# Altium footprint library DBLib.PcbLib: 92 footprints (part 2 of 6)
Each footprint in its own frame and in the unit in brackets; x right, y up, seen from the top. Pads: shape width x height; smd on the part's side, far side on the other; paste and mask are expansions set on the pad; w line width, h text height; cw(c..) or ccw(c..) is an arc to the next point about the centre after c.
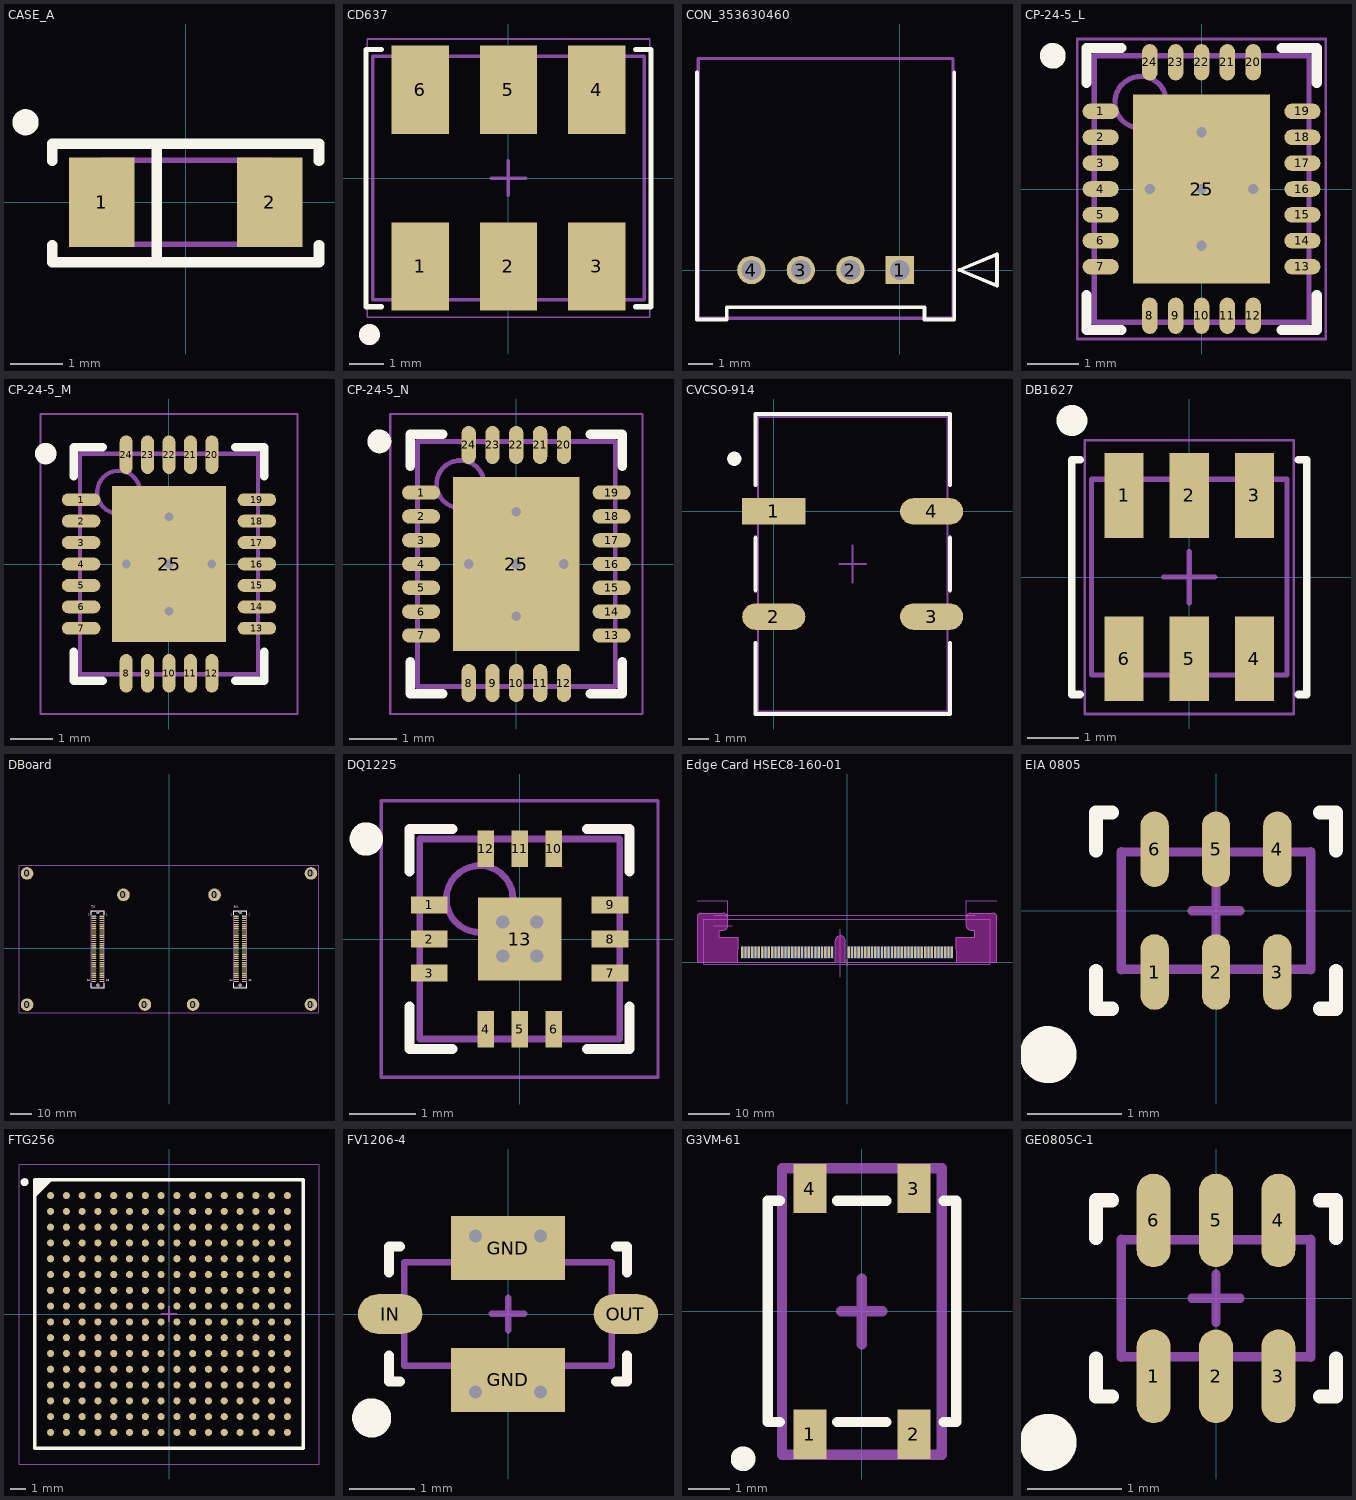
[diagram p1: the footprints below, top view; thin cyan lines are the x and y axes]

## CASE_A [mm] "Tantalum Cap"
height 0.5
pads (2):
  rect 1.25x1.7 smd: 1(-1.6,0) 2(1.6,0)
Top Overlay:
  circle w0.25: c-3.048,1.524 r0.125
  lines w0.2: -2.54,-0.815 -2.54,-1.143 2.54,-1.143 2.54,-0.815 ; -2.54,0.787 -2.54,1.115 2.54,1.115 2.54,0.787 ; -0.546,-1.143 -0.546,1.115
Mechanical 1:
  lines w0.1: -1.6,-0.8 -1.6,0.8 1.6,0.8 1.6,-0.8 -1.6,-0.8
3D body "User Library-Tantalum Capacitor Case A.STEP": height 1.65, standoff 0, extent -1.698,-0.802 1.693,0.798

## CD637 [mm] "RF Transformer"
height 5.23
pads (6):
  rect 1.65x2.54 smd: 1(-2.54,-2.54) 2(0,-2.54) 3(2.54,-2.54) 4(2.54,2.54) 5(0,2.54) 6(-2.54,2.54)
Top Overlay:
  circle w0.35: c-4,-4.5 r0.127
  lines w0.15: -3.65,-3.7 -4.1,-3.7 -4.1,3.7 -3.65,3.7 ; 3.65,-3.7 4.1,-3.7 4.1,3.7 3.65,3.7
Mechanical 1:
  lines w0.05: -4.064,-4 4.064,-4 4.064,4 -4.064,4 -4.064,-4
  lines w0.1: -0.5,0 0.5,0 ; 0,-0.5 0,0.5 ; -3.9,-3.5 3.9,-3.5 3.9,3.5 -3.9,3.5 -3.9,-3.5
3D body "User Library-CD637.step": height 5.24, standoff 0, extent -3.935,-3.455 3.935,3.455

## CON_353630460 [mm]
pads (4):
  rect 1.15x1.15 hole 0.8 mask+0.076: 1(0,0)
  round 1.15 hole 0.8 mask+0.076: 2(-2,0) 3(-4,0) 4(-6,0)
Top Overlay:
  lines w0.15: -8.2,8 -8.2,-2 -7,-2 -7,-1.5 1,-1.5 1,-2 2.2,-2 2.2,8 ; 2.404,0 3.928,-0.635 3.928,0.635 2.404,0
Mechanical 1:
  lines w0.127: -8.15,-1.95 -8.15,8.55 2.15,8.55 2.15,-1.95 -8.15,-1.95 ; 2.404,0 3.928,-0.635 3.928,0.635 2.404,0
3D body "353630460.stp": height 5.55, standoff -3.15, extent -8.15,-1.95 2.15,8.55
3D body: height 0.25, standoff 0, extent 0,0 0.254,0.254

## CP-24-5_L [mm] "QFN, 24-Leads, Body 4x5mm, Pitch 0.5mm, Thermal Pad 2.65x3.65mm, IPC High Density"
height 1
pads (25):
  oval 0.7x0.3 smd: 1(-1.95,1.5) 2(-1.95,1) 3(-1.95,0.5) 4(-1.95,0) 5(-1.95,-0.5) 6(-1.95,-1) 7(-1.95,-1.5) 13(1.95,-1.5) 14(1.95,-1) 15(1.95,-0.5) 16(1.95,0) 17(1.95,0.5) 18(1.95,1) 19(1.95,1.5)
  oval 0.3x0.7 smd: 8(-1,-2.45) 9(-0.5,-2.45) 10(0,-2.45) 11(0.5,-2.45) 12(1,-2.45) 20(1,2.45) 21(0.5,2.45) 22(0,2.45) 23(-0.5,2.45) 24(-1,2.45)
  rect 2.65x3.65 all layers, no hole paste-1.325 mask+0.102: 25(0,0)
via 0,-1.1 diameter 0.5 hole 0.2
via 1,0 diameter 0.5 hole 0.2
via -1,0 diameter 0.5 hole 0.2
via 0,1.1 diameter 0.5 hole 0.2
via 0,0 diameter 0.5 hole 0.2
Top Overlay:
  circle w0.25: c-2.875,2.575 r0.125
  lines w0.2: -2.225,-2.05 -2.225,-2.725 -1.55,-2.725 ; -2.225,2.05 -2.225,2.725 -1.55,2.725 ; 1.55,-2.725 2.225,-2.725 2.225,-2.05 ; 1.55,2.725 2.225,2.725 2.225,2.05
Top Paste:
  rectangle: 0.15,0.15 1.25,1.75
  region: -0.15,1.75 -1.25,1.75 -1.25,0.15 -0.15,0.15
  region: -0.15,-0.15 -1.25,-0.15 -1.25,-1.75 -0.15,-1.75
  rectangle: 0.15,-1.75 1.25,-0.15
Mechanical 13:
  circle w0.1: c-1.175,1.675 r0.5
  lines w0.1: -2.075,-2.575 2.075,-2.575 2.075,2.575 -2.075,2.575 -2.075,-2.575
Mechanical 15:
  lines w0.05: -2.4,-2.9 2.4,-2.9 2.4,2.9 -2.4,2.9 -2.4,-2.9
  lines w0.1: -0.5,0 0.5,0 ; 0,-0.5 0,0.5
3D body "User Library-AD5760BCPZ.step": height 0.85, standoff -0.05, extent -2.001,-2.501 2.001,2.501

## CP-24-5_M [mm] "QFN, 24-Leads, Body 4x5mm, Pitch 0.5mm, Thermal Pad 2.65x3.65mm, IPC Low Density"
height 1
pads (25):
  oval 0.9x0.3 smd: 1(-2.05,1.5) 2(-2.05,1) 3(-2.05,0.5) 4(-2.05,0) 5(-2.05,-0.5) 6(-2.05,-1) 7(-2.05,-1.5) 13(2.05,-1.5) 14(2.05,-1) 15(2.05,-0.5) 16(2.05,0) 17(2.05,0.5) 18(2.05,1) 19(2.05,1.5)
  oval 0.3x0.9 smd: 8(-1,-2.55) 9(-0.5,-2.55) 10(0,-2.55) 11(0.5,-2.55) 12(1,-2.55) 20(1,2.55) 21(0.5,2.55) 22(0,2.55) 23(-0.5,2.55) 24(-1,2.55)
  rect 2.65x3.65 all layers, no hole paste-1.325 mask+0.102: 25(0,0)
via 0,-1.1 diameter 0.5 hole 0.2
via 1,0 diameter 0.5 hole 0.2
via -1,0 diameter 0.5 hole 0.2
via 0,1.1 diameter 0.5 hole 0.2
via 0,0 diameter 0.5 hole 0.2
Top Overlay:
  circle w0.25: c-2.875,2.575 r0.125
  lines w0.2: -2.225,-2.05 -2.225,-2.725 -1.55,-2.725 ; -2.225,2.05 -2.225,2.725 -1.55,2.725 ; 1.55,-2.725 2.225,-2.725 2.225,-2.05 ; 1.55,2.725 2.225,2.725 2.225,2.05
Top Paste:
  rectangle: 0.15,0.15 1.25,1.75
  region: -0.15,1.75 -1.25,1.75 -1.25,0.15 -0.15,0.15
  region: -0.15,-0.15 -1.25,-0.15 -1.25,-1.75 -0.15,-1.75
  rectangle: 0.15,-1.75 1.25,-0.15
Mechanical 13:
  circle w0.1: c-1.175,1.675 r0.5
  lines w0.1: -2.075,-2.575 -2.075,2.575 2.075,2.575 2.075,-2.575 -2.075,-2.575
Mechanical 15:
  lines w0.05: -3,-3.5 -3,3.5 3,3.5 3,-3.5 -3,-3.5
  lines w0.1: -0.5,0 0.5,0 ; 0,-0.5 0,0.5
3D body "User Library-AD5760BCPZ.step": height 0.85, standoff -0.05, extent -2.001,-2.501 2.001,2.501

## CP-24-5_N [mm] "QFN, 24-Leads, Body 4x5mm, Pitch 0.5mm, Thermal Pad 2.65x3.65mm, IPC Medium Density"
height 1
pads (25):
  oval 0.8x0.3 smd: 1(-2,1.5) 2(-2,1) 3(-2,0.5) 4(-2,0) 5(-2,-0.5) 6(-2,-1) 7(-2,-1.5) 13(2,-1.5) 14(2,-1) 15(2,-0.5) 16(2,0) 17(2,0.5) 18(2,1) 19(2,1.5)
  oval 0.3x0.8 smd: 8(-1,-2.5) 9(-0.5,-2.5) 10(0,-2.5) 11(0.5,-2.5) 12(1,-2.5) 20(1,2.5) 21(0.5,2.5) 22(0,2.5) 23(-0.5,2.5) 24(-1,2.5)
  rect 2.65x3.65 all layers, no hole paste-1.325 mask+0.102: 25(0,0)
via 0,0 diameter 0.5 hole 0.2
via 0,1.1 diameter 0.5 hole 0.2
via -1,0 diameter 0.5 hole 0.2
via 1,0 diameter 0.5 hole 0.2
via 0,-1.1 diameter 0.5 hole 0.2
Top Overlay:
  circle w0.25: c-2.875,2.575 r0.125
  lines w0.2: -2.225,-2.05 -2.225,-2.725 -1.55,-2.725 ; -2.225,2.05 -2.225,2.725 -1.55,2.725 ; 1.55,-2.725 2.225,-2.725 2.225,-2.05 ; 1.55,2.725 2.225,2.725 2.225,2.05
Top Paste:
  rectangle: 0.15,-1.75 1.25,-0.15
  region: -0.15,-0.15 -1.25,-0.15 -1.25,-1.75 -0.15,-1.75
  region: -0.15,1.75 -1.25,1.75 -1.25,0.15 -0.15,0.15
  rectangle: 0.15,0.15 1.25,1.75
Mechanical 13:
  circle w0.1: c-1.175,1.675 r0.5
  lines w0.1: -2.075,-2.575 -2.075,2.575 2.075,2.575 2.075,-2.575 -2.075,-2.575
Mechanical 15:
  lines w0.05: -2.65,-3.15 -2.65,3.15 2.65,3.15 2.65,-3.15 -2.65,-3.15
  lines w0.1: -0.5,0 0.5,0 ; 0,-0.5 0,0.5
3D body "User Library-AD5760BCPZ.step": height 0.85, standoff -0.05, extent -2.001,-2.501 2.001,2.501

## CVCSO-914 [mil] "9?14 mm SMD"
height 210
pads (4):
  rect 120x50 smd: 1(0,0)
  oval 120x50 smd: 2(0,-200) 3(300,-200) 4(300,0)
Top Overlay:
  circle w13.78: c-75,100 r6.63
  lines w7.87: -35,-250 -35,-385 335,-385 335,-250 ; -35,-150 -35,-50 ; -35,50 -35,185 335,185 335,50 ; 335,-150 335,-50
Mechanical 1:
  lines w3.94: 125,-100 175,-100 ; 150,-135 150,-65 ; -30.31,-380 -30.31,179.05 330.31,179.05 330.31,-380 -30.31,-380
3D body "User Library-CVHD-950.step": height 208.66, standoff 0, extent -30.31,-380 330.31,179.05

## DB1627 [mm] "RF Transformer"
height 4.06
pads (6):
  rect 0.76x1.65 smd: 1(-1.27,1.59) 2(0,1.59) 3(1.27,1.59) 4(1.27,-1.59) 5(0,-1.59) 6(-1.27,-1.59)
Top Overlay:
  circle w0.35: c-2.286,3.048 r0.127
  lines w0.15: -2.126,-2.286 -2.286,-2.286 -2.286,2.286 -2.126,2.286 ; 2.126,-2.286 2.286,-2.286 2.286,2.286 2.126,2.286
Mechanical 1:
  lines w0.05: -2.032,-2.667 2.032,-2.667 2.032,2.667 -2.032,2.667 -2.032,-2.667
  lines w0.1: -0.5,0 0.5,0 ; 0,-0.5 0,0.5 ; -1.905,-1.905 1.905,-1.905 1.905,1.905 -1.905,1.905 -1.905,-1.905
3D body "User Library-RF Transformer SMD.step": height 2.79, standoff -0.02, extent -1.905,-1.923 1.905,1.923

## DBoard [mil] "USRP DBoard"
height 393.7
pads (140):
  round 236.22 hole 118.11: 0(-2650,1400) 0(-2649,-1051) 0(-850,1000) 0(-450,-1050) 0(450,-1050) 0(850,1000) 0(2650,-1050) 0(2650,1400)
  round 59.06 hole 59.06 unplated: 0(-1330,-687) 0(-1330,667) 0(1330,-687) 0(1330,667)
  oval 92x24 smd: 1(-1256,600) 2(-1404,600) 3(-1256,561) 4(-1404,561) 5(-1256,522) 6(-1404,522) 7(-1256,482) 8(-1404,482) 9(-1256,443) 10(-1404,443) 11(-1256,404) 12(-1404,404) 13(-1256,364) 14(-1404,364) 15(-1256,325) 16(-1404,325) 17(-1256,286) 18(-1404,286) 19(-1256,246) 20(-1404,246) 21(-1256,207) 22(-1404,207) 23(-1256,167) 24(-1404,167) 25(-1256,128) 26(-1404,128) 27(-1256,89) 28(-1404,89) 29(-1256,49) 30(-1404,49) 31(-1256,10) 32(-1404,10) 33(-1256,-29) 34(-1404,-29) 35(-1256,-69) 36(-1404,-69) 37(-1256,-108) 38(-1404,-108) 39(-1256,-148) 40(-1404,-148) 41(-1256,-187) 42(-1404,-187) 43(-1256,-226) 44(-1404,-226) 45(-1256,-266) 46(-1404,-266) 47(-1256,-305) 48(-1404,-305) 49(-1256,-344) 50(-1404,-344) 51(-1256,-384) 52(-1404,-384) 53(-1256,-423) 54(-1404,-423) 55(-1256,-462) 56(-1404,-462) 57(-1256,-502) 58(-1404,-502) 59(-1256,-541) 60(-1404,-541) 61(-1256,-581) 62(-1404,-581) 63(-1256,-620) 64(-1404,-620) 65(1404,600) 66(1256,600) 67(1404,561) 68(1256,561) 69(1404,522) 70(1256,522) 71(1404,482) 72(1256,482) 73(1404,443) 74(1256,443) 75(1404,404) 76(1256,404) 77(1404,364) 78(1256,364) 79(1404,325) 80(1256,325) 81(1404,286) 82(1256,286) 83(1404,246) 84(1256,246) 85(1404,207) 86(1256,207) 87(1404,167) 88(1256,167) 89(1404,128) 90(1256,128) 91(1404,89) 92(1256,89) 93(1404,49) 94(1256,49) 95(1404,10) 96(1256,10) 97(1404,-29) 98(1256,-29) 99(1404,-69) 100(1256,-69) 101(1404,-108) 102(1256,-108) 103(1404,-148) 104(1256,-148) 105(1404,-187) 106(1256,-187) 107(1404,-226) 108(1256,-226) 109(1404,-266) 110(1256,-266) 111(1404,-305) 112(1256,-305) 113(1404,-344) 114(1256,-344) 115(1404,-384) 116(1256,-384) 117(1404,-423) 118(1256,-423) 119(1404,-462) 120(1256,-462) 121(1404,-502) 122(1256,-502) 123(1404,-541) 124(1256,-541) 125(1404,-581) 126(1256,-581) 127(1404,-620) 128(1256,-620)
Top Overlay:
  lines w7: -1455,-651.9 -1455,-730.64 -1205,-730.64 -1205,-651.9 ; -1455,627.63 -1455,706.37 -1205,706.37 -1205,627.63 ; 1205,-651.9 1205,-730.64 1455,-730.64 1455,-651.9 ; 1205,627.63 1205,706.37 1455,706.37 1455,627.63
  text "64" at 1130,-630 h50
  text "63" at 1490,-630 h50
  text "2" at 1150,590 h50
  text "1" at 1490,590 h50
  text "RX" at 1210,730 h78.74
  text "64" at -1530,-630 h50
  text "63" at -1170,-630 h50
  text "2" at -1510,590 h50
  text "1" at -1170,590 h50
  text "TX" at -1450,730 h78.74
Mechanical 1:
  lines w3.94: -1450.08,-716.86 -1450.08,696.53 -1209.92,696.53 -1209.92,-716.86 -1450.08,-716.86 ; 1209.92,-716.86 1209.92,696.53 1450.08,696.53 1450.08,-716.86 1209.92,-716.86
  lines w10: -2800,-1200 2800,-1200 2800,1550 -2800,1550 -2800,-1200
3D body "714390164.stp": height 209.02, standoff -31, extent 1209.92,-716.85 1450.08,696.54
3D body "714390164.stp": height 209.02, standoff -31, extent -1450.08,-716.85 -1209.92,696.54

## DQ1225 [mm] "QFN, 12-Leads, Body 3,00x3,00mm, Pitch 0,51mm, Thermal Pad 1,45x1,45mm, IPC Medium Density"
height 0.9
pads (13):
  rect 0.55x0.25 smd: 1(-1.355,0.51) 2(-1.355,0) 3(-1.355,-0.51) 7(1.355,-0.51) 8(1.355,0) 9(1.355,0.51)
  rect 0.25x0.55 smd: 4(-0.51,-1.355) 5(0,-1.355) 6(0.51,-1.355) 10(0.51,1.355) 11(0,1.355) 12(-0.51,1.355)
  rect 1.25x1.25 all layers, no hole mask+0.102: 13(0,0)
via -0.254,0.254 diameter 0.4 hole 0.2
via 0.254,0.254 diameter 0.4 hole 0.2
via 0.254,-0.254 diameter 0.4 hole 0.2
via -0.254,-0.254 diameter 0.4 hole 0.2
Top Overlay:
  circle w0.25: c-2.3,1.5 r0.125
  lines w0.15: -1.65,-1.01 -1.65,-1.65 -1.01,-1.65 ; -1.65,1.01 -1.65,1.65 -1.01,1.65 ; 1.01,-1.65 1.65,-1.65 1.65,-1.01 ; 1.01,1.65 1.65,1.65 1.65,1.01
Mechanical 1:
  circle w0.1: c-0.6,0.6 r0.5
  lines w0.05: -2.075,-2.075 2.075,-2.075 2.075,2.075 -2.075,2.075 -2.075,-2.075
  lines w0.1: -0.5,0 0.5,0 ; 0,-0.5 0,0.5 ; -1.5,-1.5 1.5,-1.5 1.5,1.5 -1.5,1.5 -1.5,-1.5
3D body "User Library-QFN12_3x3x0_8.step": height 0.78, standoff -0.02, extent -1.51,-1.51 1.51,1.51

## Edge Card HSEC8-160-01 [mm] "0.80 mm High-Speed Edge Card"
pads (120):
  rect 0.55x2.8 smd far side: 1(25.2,2.4) 3(24.4,2.4) 5(23.6,2.4) 7(22.8,2.4) 9(22,2.4) 11(21.2,2.4) 13(20.4,2.4) 15(19.6,2.4) 17(18.8,2.4) 19(18,2.4) 21(17.2,2.4) 23(16.4,2.4) 25(15.6,2.4) 27(14.8,2.4) 29(14,2.4) 31(13.2,2.4) 33(12.4,2.4) 35(11.6,2.4) 37(10.8,2.4) 39(10,2.4) 41(9.2,2.4) 43(8.4,2.4) 45(7.6,2.4) 47(6.8,2.4) 49(6,2.4) 51(5.2,2.4) 53(4.4,2.4) 55(3.6,2.4) 57(2.8,2.4) 59(2,2.4) 61(1.2,2.4) 63(0.4,2.4) 65(-3.6,2.4) 67(-4.4,2.4) 69(-5.2,2.4) 71(-6,2.4) 73(-6.8,2.4) 75(-7.6,2.4) 77(-8.4,2.4) 79(-9.2,2.4) 81(-10,2.4) 83(-10.8,2.4) 85(-11.6,2.4) 87(-12.4,2.4) 89(-13.2,2.4) 91(-14,2.4) 93(-14.8,2.4) 95(-15.6,2.4) 97(-16.4,2.4) 99(-17.2,2.4) 101(-18,2.4) 103(-18.8,2.4) 105(-19.6,2.4) 107(-20.4,2.4) 109(-21.2,2.4) 111(-22,2.4) 113(-22.8,2.4) 115(-23.6,2.4) 117(-24.4,2.4) 119(-25.2,2.4)
  rect 0.55x2.8 smd: 2(25.2,2.4) 4(24.4,2.4) 6(23.6,2.4) 8(22.8,2.4) 10(22,2.4) 12(21.2,2.4) 14(20.4,2.4) 16(19.6,2.4) 18(18.8,2.4) 20(18,2.4) 22(17.2,2.4) 24(16.4,2.4) 26(15.6,2.4) 28(14.8,2.4) 30(14,2.4) 32(13.2,2.4) 34(12.4,2.4) 36(11.6,2.4) 38(10.8,2.4) 40(10,2.4) 42(9.2,2.4) 44(8.4,2.4) 46(7.6,2.4) 48(6.8,2.4) 50(6,2.4) 52(5.2,2.4) 54(4.4,2.4) 56(3.6,2.4) 58(2.8,2.4) 60(2,2.4) 62(1.2,2.4) 64(0.4,2.4) 66(-3.6,2.4) 68(-4.4,2.4) 70(-5.2,2.4) 72(-6,2.4) 74(-6.8,2.4) 76(-7.6,2.4) 78(-8.4,2.4) 80(-9.2,2.4) 82(-10,2.4) 84(-10.8,2.4) 86(-11.6,2.4) 88(-12.4,2.4) 90(-13.2,2.4) 92(-14,2.4) 94(-14.8,2.4) 96(-15.6,2.4) 98(-16.4,2.4) 100(-17.2,2.4) 102(-18,2.4) 104(-18.8,2.4) 106(-19.6,2.4) 108(-20.4,2.4) 110(-21.2,2.4) 112(-22,2.4) 114(-22.8,2.4) 116(-23.6,2.4) 118(-24.4,2.4) 120(-25.2,2.4)
Keep-Out Layer:
  board cut-out: -2.8,0 -0.4,0 -0.4,5.2 -0.4,5.358 -0.482,5.663 -0.64,5.937 -0.863,6.16 -1.137,6.318 -1.442,6.4 -1.758,6.4 -2.063,6.318 -2.337,6.16 -2.56,5.937 -2.718,5.663 -2.8,5.358 -2.8,5.2
  board cut-out: 36.075,0 36.075,10.82 36.075,10.918 36.037,11.112 35.961,11.294 35.852,11.457 35.712,11.597 35.549,11.706 35.367,11.782 35.173,11.82 35.075,11.82 29.725,11.82 29.627,11.82 29.433,11.782 29.251,11.706 29.088,11.597 28.948,11.457 28.839,11.294 28.763,11.112 28.725,10.918 28.725,10.82 28.725,8.78 28.725,8.682 28.763,8.488 28.839,8.306 28.948,8.143 29.088,8.003 29.251,7.894 29.433,7.818 29.627,7.78 29.725,7.78 30.725,7.78 30.725,6 26.2,6 26.226,0
  board cut-out: -36.075,0 -36.075,10.82 -36.075,10.918 -36.037,11.112 -35.961,11.294 -35.852,11.457 -35.712,11.597 -35.549,11.706 -35.367,11.782 -35.173,11.82 -35.075,11.82 -29.725,11.82 -29.627,11.82 -29.433,11.782 -29.251,11.706 -29.088,11.597 -28.948,11.457 -28.839,11.294 -28.763,11.112 -28.725,10.918 -28.725,10.82 -28.725,8.78 -28.725,8.682 -28.763,8.488 -28.839,8.306 -28.948,8.143 -29.088,8.003 -29.251,7.894 -29.433,7.818 -29.627,7.78 -29.725,7.78 -30.725,7.78 -30.725,6 -26.2,6 -26.226,0
Mechanical 1:
  lines w0.15: -34.4,-0.4 34.4,-0.4 34.4,10.4 -34.4,10.4 -34.4,-0.4
  lines w0.2: -0.8,0 0.8,0 ; 0,-0.8 0,0.8
Mechanical 15:
  lines w0.1: -36.075,0 -36.075,10.82 cw(c-35.075,10.82) -35.075,11.82 -29.725,11.82 cw(c-29.725,10.82) -28.725,10.82 -28.725,8.78 cw(c-29.725,8.78) -29.725,7.78 -30.725,7.78 -30.725,6 -26.2,6 -26.226,0 -36.075,0 ; 26.2,6 26.226,0 36.075,0 36.075,10.82 ccw(c35.075,10.82) 35.075,11.82 29.725,11.82 ccw(c29.725,10.82) 28.725,10.82 28.725,8.78 ccw(c29.725,8.78) 29.725,7.78 30.725,7.78 30.725,6 26.2,6
Boarder:
  lines w0.1: -36,14.84 -28.725,14.84 -28.725,8.78 cw(c-29.725,8.78) -29.725,7.78 -30.725,7.78 -30.725,6 -26.2,6 -26.226,0 -2.8,0 -2.8,5.2 cw(c-1.6,5.2) -0.4,5.2 -0.4,0 26.225,0 26.2,6 30.725,6 30.725,7.78 ; 36,14.84 28.725,14.84 28.725,8.78 ccw(c29.725,8.78) 29.725,7.78 30.725,7.78 ; 30.725,7.78 30.725,7.78
Supp Geometry:
  lines w0.1: -32,8.78 -27.6,8.78 ; -32,11.38 30.8,11.38 ; -1.6,-3.6 -1.6,8
3D body "HSEC8-160-01-S-RA-BL.stp": height 2.36, standoff -5.04, extent -33.65,-5.85 33.65,9.8

## EIA 0805 [mm] "Multilayer Balun"
height 0.95
pads (6):
  oval 0.3x0.8 smd: 1(-0.65,-0.65) 2(0,-0.65) 3(0.65,-0.65) 4(0.65,0.65) 5(0,0.65) 6(-0.65,0.65)
Top Overlay:
  circle w0.35: c-1.778,-1.524 r0.127
  lines w0.15: -1.27,-0.638 -1.27,-1.038 -1.101,-1.038 ; -1.27,0.638 -1.27,1.038 -1.101,1.038 ; 1.101,-1.038 1.27,-1.038 1.27,-0.638 ; 1.101,1.038 1.27,1.038 1.27,0.638
Mechanical 1:
  lines w0.1: -1.005,-0.625 -1.005,0.625 ; -1.005,-0.62 1,-0.62 ; -1.005,0.62 1,0.62 ; -0.254,0 0.254,0 ; 0,-0.254 0,0.254 ; 1.005,-0.625 1.005,0.625
3D body "User Library-Balun2450FB15L0001.step": height 0.8, standoff 0, extent -1,-0.625 1,0.625

## FTG256 [mm] "BGA, 256-Leads, Body 17x17mm, Pitch 1mm"
height 1.55
pads (256):
  round 0.45 smd: A1(-7.5,7.5) A2(-6.5,7.5) A3(-5.5,7.5) A4(-4.5,7.5) A5(-3.5,7.5) A6(-2.5,7.5) A7(-1.5,7.5) A8(-0.5,7.5) A9(0.5,7.5) A10(1.5,7.5) A11(2.5,7.5) A12(3.5,7.5) A13(4.5,7.5) A14(5.5,7.5) A15(6.5,7.5) A16(7.5,7.5) B1(-7.5,6.5) B2(-6.5,6.5) B3(-5.5,6.5) B4(-4.5,6.5) B5(-3.5,6.5) B6(-2.5,6.5) B7(-1.5,6.5) B8(-0.5,6.5) B9(0.5,6.5) B10(1.5,6.5) B11(2.5,6.5) B12(3.5,6.5) B13(4.5,6.5) B14(5.5,6.5) B15(6.5,6.5) B16(7.5,6.5) C1(-7.5,5.5) C2(-6.5,5.5) C3(-5.5,5.5) C4(-4.5,5.5) C5(-3.5,5.5) C6(-2.5,5.5) C7(-1.5,5.5) C8(-0.5,5.5) C9(0.5,5.5) C10(1.5,5.5) C11(2.5,5.5) C12(3.5,5.5) C13(4.5,5.5) C14(5.5,5.5) C15(6.5,5.5) C16(7.5,5.5) D1(-7.5,4.5) D2(-6.5,4.5) D3(-5.5,4.5) D4(-4.5,4.5) D5(-3.5,4.5) D6(-2.5,4.5) D7(-1.5,4.5) D8(-0.5,4.5) D9(0.5,4.5) D10(1.5,4.5) D11(2.5,4.5) D12(3.5,4.5) D13(4.5,4.5) D14(5.5,4.5) D15(6.5,4.5) D16(7.5,4.5) E1(-7.5,3.5) E2(-6.5,3.5) E3(-5.5,3.5) E4(-4.5,3.5) E5(-3.5,3.5) E6(-2.5,3.5) E7(-1.5,3.5) E8(-0.5,3.5) E9(0.5,3.5) E10(1.5,3.5) E11(2.5,3.5) E12(3.5,3.5) E13(4.5,3.5) E14(5.5,3.5) E15(6.5,3.5) E16(7.5,3.5) F1(-7.5,2.5) F2(-6.5,2.5) F3(-5.5,2.5) F4(-4.5,2.5) F5(-3.5,2.5) F6(-2.5,2.5) F7(-1.5,2.5) F8(-0.5,2.5) F9(0.5,2.5) F10(1.5,2.5) F11(2.5,2.5) F12(3.5,2.5) F13(4.5,2.5) F14(5.5,2.5) F15(6.5,2.5) F16(7.5,2.5) G1(-7.5,1.5) G2(-6.5,1.5) G3(-5.5,1.5) G4(-4.5,1.5) G5(-3.5,1.5) G6(-2.5,1.5) G7(-1.5,1.5) G8(-0.5,1.5) G9(0.5,1.5) G10(1.5,1.5) G11(2.5,1.5) G12(3.5,1.5) G13(4.5,1.5) G14(5.5,1.5) G15(6.5,1.5) G16(7.5,1.5) H1(-7.5,0.5) H2(-6.5,0.5) H3(-5.5,0.5) H4(-4.5,0.5) H5(-3.5,0.5) H6(-2.5,0.5) H7(-1.5,0.5) H8(-0.5,0.5) H9(0.5,0.5) H10(1.5,0.5) H11(2.5,0.5) H12(3.5,0.5) H13(4.5,0.5) H14(5.5,0.5) H15(6.5,0.5) H16(7.5,0.5) J1(-7.5,-0.5) J2(-6.5,-0.5) J3(-5.5,-0.5) J4(-4.5,-0.5) J5(-3.5,-0.5) J6(-2.5,-0.5) J7(-1.5,-0.5) J8(-0.5,-0.5) J9(0.5,-0.5) J10(1.5,-0.5) J11(2.5,-0.5) J12(3.5,-0.5) J13(4.5,-0.5) J14(5.5,-0.5) J15(6.5,-0.5) J16(7.5,-0.5) K1(-7.5,-1.5) K2(-6.5,-1.5) K3(-5.5,-1.5) K4(-4.5,-1.5) K5(-3.5,-1.5) K6(-2.5,-1.5) K7(-1.5,-1.5) K8(-0.5,-1.5) K9(0.5,-1.5) K10(1.5,-1.5) K11(2.5,-1.5) K12(3.5,-1.5) K13(4.5,-1.5) K14(5.5,-1.5) K15(6.5,-1.5) K16(7.5,-1.5) L1(-7.5,-2.5) L2(-6.5,-2.5) L3(-5.5,-2.5) L4(-4.5,-2.5) L5(-3.5,-2.5) L6(-2.5,-2.5) L7(-1.5,-2.5) L8(-0.5,-2.5) L9(0.5,-2.5) L10(1.5,-2.5) L11(2.5,-2.5) L12(3.5,-2.5) L13(4.5,-2.5) L14(5.5,-2.5) L15(6.5,-2.5) L16(7.5,-2.5) M1(-7.5,-3.5) M2(-6.5,-3.5) M3(-5.5,-3.5) M4(-4.5,-3.5) M5(-3.5,-3.5) M6(-2.5,-3.5) M7(-1.5,-3.5) M8(-0.5,-3.5) M9(0.5,-3.5) M10(1.5,-3.5) M11(2.5,-3.5) M12(3.5,-3.5) M13(4.5,-3.5) M14(5.5,-3.5) M15(6.5,-3.5) M16(7.5,-3.5) N1(-7.5,-4.5) N2(-6.5,-4.5) N3(-5.5,-4.5) N4(-4.5,-4.5) N5(-3.5,-4.5) N6(-2.5,-4.5) N7(-1.5,-4.5) N8(-0.5,-4.5) N9(0.5,-4.5) N10(1.5,-4.5) N11(2.5,-4.5) N12(3.5,-4.5) N13(4.5,-4.5) N14(5.5,-4.5) N15(6.5,-4.5) N16(7.5,-4.5) P1(-7.5,-5.5) P2(-6.5,-5.5) P3(-5.5,-5.5) P4(-4.5,-5.5) P5(-3.5,-5.5) P6(-2.5,-5.5) P7(-1.5,-5.5) P8(-0.5,-5.5) P9(0.5,-5.5) P10(1.5,-5.5) P11(2.5,-5.5) P12(3.5,-5.5) P13(4.5,-5.5) P14(5.5,-5.5) P15(6.5,-5.5) P16(7.5,-5.5) R1(-7.5,-6.5) R2(-6.5,-6.5) R3(-5.5,-6.5) R4(-4.5,-6.5) R5(-3.5,-6.5) R6(-2.5,-6.5) R7(-1.5,-6.5) R8(-0.5,-6.5) R9(0.5,-6.5) R10(1.5,-6.5) R11(2.5,-6.5) R12(3.5,-6.5) R13(4.5,-6.5) R14(5.5,-6.5) R15(6.5,-6.5) R16(7.5,-6.5) T1(-7.5,-7.5) T2(-6.5,-7.5) T3(-5.5,-7.5) T4(-4.5,-7.5) T5(-3.5,-7.5) T6(-2.5,-7.5) T7(-1.5,-7.5) T8(-0.5,-7.5) T9(0.5,-7.5) T10(1.5,-7.5) T11(2.5,-7.5) T12(3.5,-7.5) T13(4.5,-7.5) T14(5.5,-7.5) T15(6.5,-7.5) T16(7.5,-7.5)
Top Overlay:
  circle w0.25: c-9.15,8.35 r0.125
  region: -7.5,8.5 -8.5,7.5 -8.5,8.5
  lines w0.2: -8.5,7.5 -7.5,8.5 ; -8.5,-8.5 -8.5,8.5 8.5,8.5 8.5,-8.5 -8.5,-8.5
Mechanical 13:
  lines w0.1: -8.5,-8.5 -8.5,8.5 8.5,8.5 8.5,-8.5 -8.5,-8.5
Mechanical 15:
  lines w0.05: -9.5,-9.5 -9.5,9.5 9.5,9.5 9.5,-9.5 -9.5,-9.5
  lines w0.1: -0.5,0 0.5,0 ; 0,-0.5 0,0.5
3D body "User Library-BGA 256 17x17mm 1mm pitch.step": height 1.7, standoff -0.05, extent -8.5,-8.5 8.5,8.5

## FV1206-4 [mm] "Bandpass Filter"
height 0.94
pads (4):
  rect 1.75x0.99 smd: GND(0,-1.015) GND(0,1.015)
  oval 0.99x0.61 smd: IN(-1.815,0) OUT(1.815,0)
via 0.5,-1.2 diameter 0.5 hole 0.2
via -0.5,-1.2 diameter 0.5 hole 0.2
via 0.5,1.2 diameter 0.5 hole 0.2
via -0.5,1.2 diameter 0.5 hole 0.2
Top Overlay:
  circle w0.35: c-2.1,-1.6 r0.127
  lines w0.15: -1.832,-0.638 -1.832,-1.038 -1.663,-1.038 ; -1.832,0.638 -1.832,1.038 -1.663,1.038 ; 1.663,-1.038 1.832,-1.038 1.832,-0.638 ; 1.663,1.038 1.832,1.038 1.832,0.638
Mechanical 1:
  lines w0.1: -0.254,0 0.254,0 ; 0,-0.254 0,0.254 ; -1.6,-0.8 1.6,-0.8 1.6,0.8 -1.6,0.8 -1.6,-0.8
3D body "User Library-LFCN-2250.STEP": height 0.94, standoff 0, extent -1.6,-0.8 1.6,0.8

## G3VM-61 [mm] "MOS FET Relays"
height 2.1
pads (4):
  rect 0.8x1.2 smd: 1(-1.27,-3) 2(1.27,-3) 3(1.27,3) 4(-1.27,3)
Top Overlay:
  circle w0.35: c-2.9,-3.6 r0.127
  lines w0.254: -2,-2.7 -2.3,-2.7 -2.3,2.7 -2,2.7 ; -0.6,-2.7 0.6,-2.7 ; -0.6,2.7 0.6,2.7 ; 2,-2.7 2.3,-2.7 2.3,2.7 2,2.7
Mechanical 1:
  lines w0.254: -0.5,0 0.5,0 ; 0,-0.8 0,0.8 ; -1.95,-3.5 -1.95,3.5 1.95,3.5 1.95,-3.5 -1.95,-3.5
3D body "g3vm-61g1.stp": height 2.05, standoff -0.05, extent -1.95,-3.5 1.95,3.5

## GE0805C-1 [mm] "RF Transformer"
height 0.94
pads (6):
  oval 0.36x0.99 smd: 1(-0.66,-0.825) 2(0,-0.825) 3(0.66,-0.825) 4(0.66,0.825) 5(0,0.825) 6(-0.66,0.825)
Top Overlay:
  circle w0.35: c-1.778,-1.524 r0.127
  lines w0.15: -1.27,-0.638 -1.27,-1.038 -1.101,-1.038 ; -1.27,0.638 -1.27,1.038 -1.101,1.038 ; 1.101,-1.038 1.27,-1.038 1.27,-0.638 ; 1.101,1.038 1.27,1.038 1.27,0.638
Mechanical 1:
  lines w0.1: -1.005,-0.625 -1.005,0.625 ; -1.005,-0.62 1,-0.62 ; -1.005,0.62 1,0.62 ; -0.254,0 0.254,0 ; 0,-0.254 0,0.254 ; 1.005,-0.625 1.005,0.625
3D body "User Library-Balun2450FB15L0001.step": height 0.8, standoff 0, extent -1,-0.625 1,0.625